# Altium footprint library PCB_IntegratedCircuit.PcbLib: 75 footprints (part 1 of 5)
Each footprint in its own frame and in the unit in brackets; x right, y up, seen from the top. Pads: shape width x height; smd on the part's side, far side on the other; paste and mask are expansions set on the pad; w line width, h text height; cw(c..) or ccw(c..) is an arc to the next point about the centre after c.
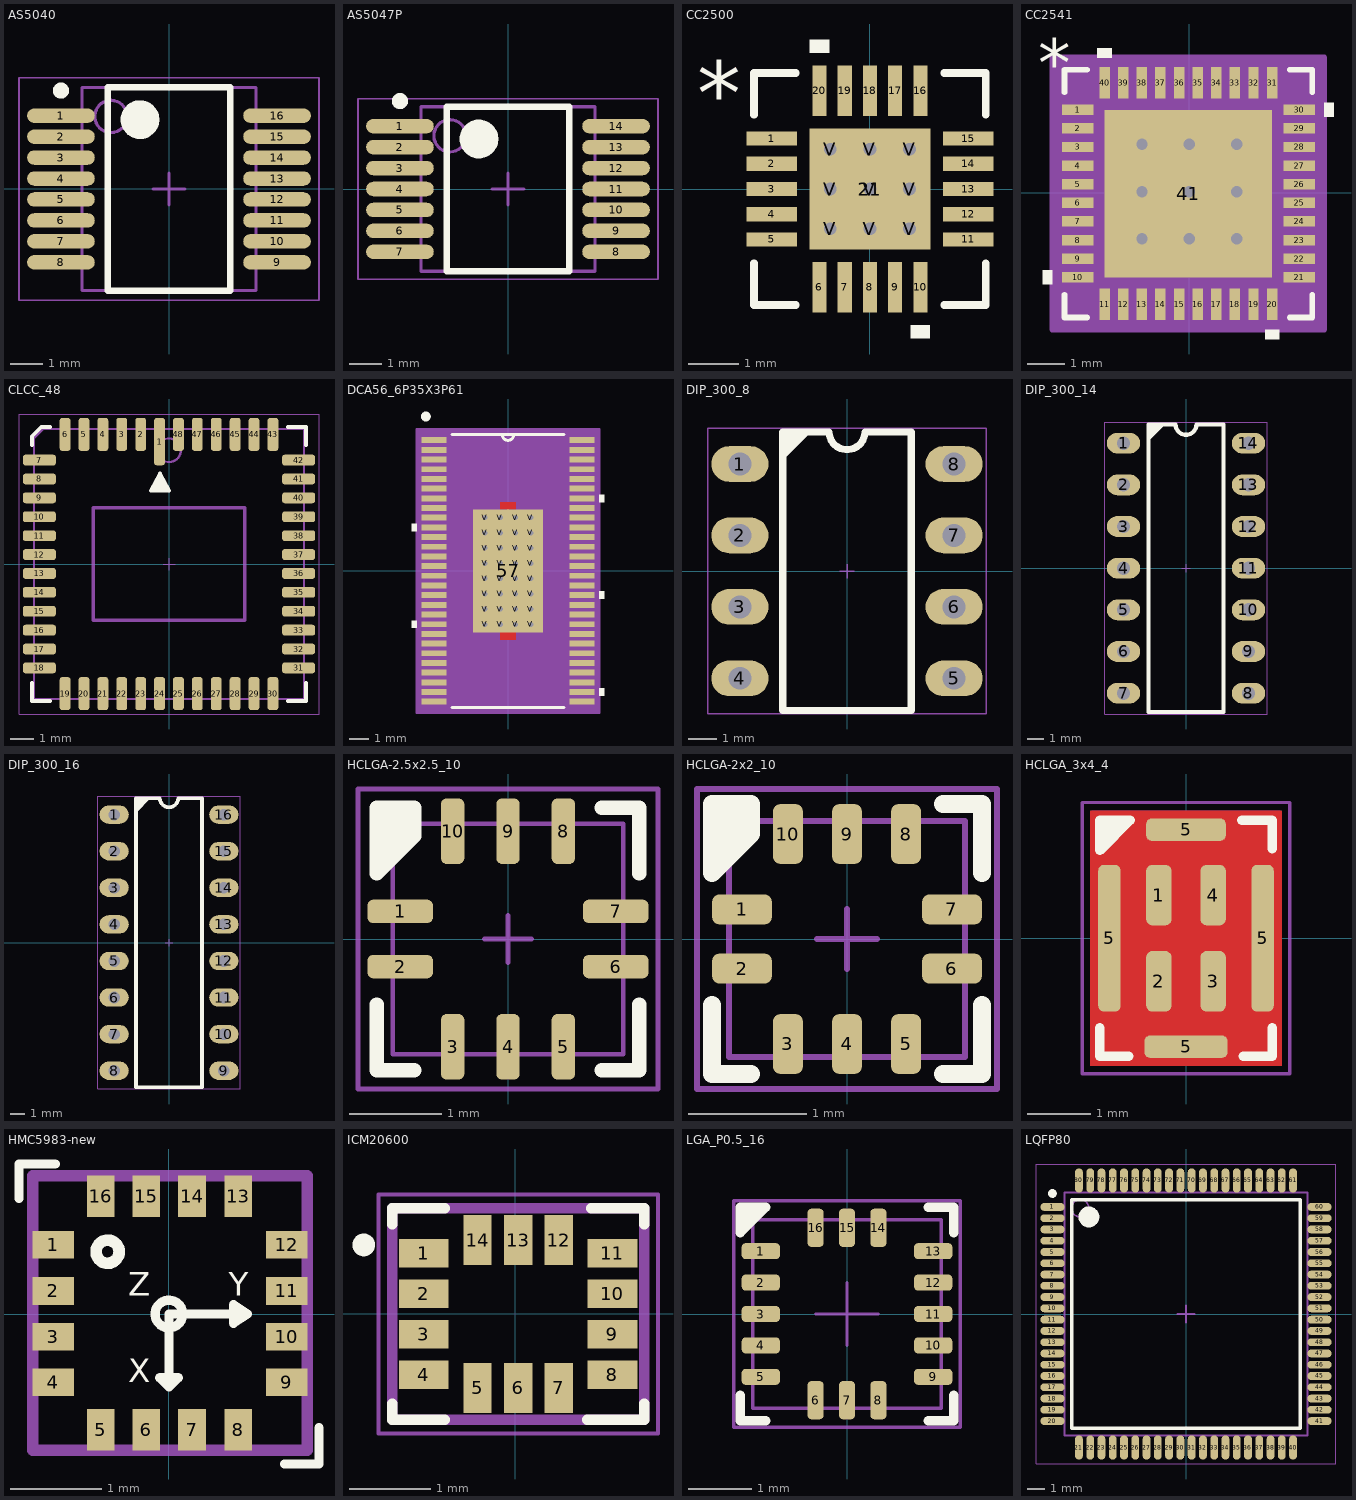
[diagram p0: the footprints below, top view; thin cyan lines are the x and y axes]

## AS5040 [mm] "SOP, 16-Leads, Body 6.20x5.29mm, Pitch 0.65mm, IPC Medium Density"
height 2.65
pads (16):
  oval 2.1x0.45 smd: 1(-3.35,2.275) 2(-3.35,1.625) 3(-3.35,0.975) 4(-3.35,0.325) 5(-3.35,-0.325) 6(-3.35,-0.975) 7(-3.35,-1.625) 8(-3.35,-2.275) 9(3.35,-2.275) 10(3.35,-1.625) 11(3.35,-0.975) 12(3.35,-0.325) 13(3.35,0.325) 14(3.35,0.975) 15(3.35,1.625) 16(3.35,2.275)
Top Overlay:
  circle w0.6: c-0.9,2.15 r0.3
  circle w0.25: c-3.35,3.05 r0.125
  lines w0.2: -1.9,-3.15 1.9,-3.15 1.9,3.15 -1.9,3.15 -1.9,-3.15
Mechanical 13:
  circle w0.1: c-1.8,2.25 r0.5
  lines w0.1: -2.7,-3.15 2.7,-3.15 2.7,3.15 -2.7,3.15 -2.7,-3.15
B-Component:
  lines w0.05: -4.65,-3.45 4.65,-3.45 4.65,3.45 -4.65,3.45 -4.65,-3.45
  lines w0.1: -0.5,0 0.5,0 ; 0,-0.5 0,0.5
3D body: height 2.65, standoff 0.1, extent -2.7,-3.15 2.7,3.15

## AS5047P [mm] "SOP, 14-Leads, Body 5.00x5.29mm, Pitch 0.65mm, IPC Medium Density"
height 2.65
pads (14):
  oval 2.1x0.45 smd: 1(-3.35,1.95) 2(-3.35,1.3) 3(-3.35,0.65) 4(-3.35,0) 5(-3.35,-0.65) 6(-3.35,-1.3) 7(-3.35,-1.95) 8(3.35,-1.95) 9(3.35,-1.3) 10(3.35,-0.65) 11(3.35,0) 12(3.35,0.65) 13(3.35,1.3) 14(3.35,1.95)
Top Overlay:
  circle w0.25: c-3.35,2.725 r0.125
  circle w0.6: c-0.9,1.55 r0.3
  lines w0.2: -1.9,-2.55 -1.9,2.55 1.9,2.55 1.9,-2.55 -1.9,-2.55
Mechanical 13:
  circle w0.1: c-1.8,1.65 r0.5
  lines w0.1: -2.7,-2.55 -2.7,2.55 2.7,2.55 2.7,-2.55 -2.7,-2.55
B-Component:
  lines w0.05: -4.65,-2.8 -4.65,2.8 4.65,2.8 4.65,-2.8 -4.65,-2.8
  lines w0.1: -0.5,0 0.5,0 ; 0,-0.5 0,0.5
3D body: height 2.65, standoff 0.1, extent -2.7,-2.55 2.7,2.55

## CC2500 [mm]
pads (30):
  rect 1x0.28 smd paste-0.14: 1(-1.95,1) 2(-1.95,0.5) 3(-1.95,0) 4(-1.95,-0.5) 5(-1.95,-1) 11(1.95,-1) 12(1.95,-0.5) 13(1.95,0) 14(1.95,0.5) 15(1.95,1)
  rect 0.28x1 smd paste-0.14: 6(-1,-1.95) 7(-0.5,-1.95) 8(0,-1.95) 9(0.5,-1.95) 10(1,-1.95) 16(1,1.95) 17(0.5,1.95) 18(0,1.95) 19(-0.5,1.95) 20(-1,1.95)
  rect 2.4x2.4 smd paste-1.187 mask-1.181: 21(0,0)
  round 0.508 / inner round 1.524 / far side round 0.508 hole 0.254: V(-0.787,-0.787) V(-0.787,0) V(-0.787,0.787) V(0,-0.787) V(0,0) V(0,0.787) V(0.787,-0.787) V(0.787,0) V(0.787,0.787)
Top Overlay:
  region: -0.81,2.704 -1.191,2.704 -1.191,2.958 -0.81,2.958
  region: 1.191,-2.704 0.81,-2.704 0.81,-2.958 1.191,-2.958
  lines w0.152: -2.299,-1.473 -2.299,-2.299 -1.473,-2.299 ; -2.299,1.473 -2.299,2.299 -1.473,2.299 ; 1.473,-2.299 2.299,-2.299 2.299,-1.473 ; 1.473,2.299 2.299,2.299 2.299,1.473
  text "*" at -3.429,1.27 h1.27
Top Paste:
  drawing of 36 lines, arcs and shapes, not listed
Top Solder:
  region: 0.987,-1.264 0.987,1.264 1.264,1.264 1.264,-1.264
  region: 0.587,-1.264 0.587,1.264 0.2,1.264 0.2,-1.264
  region: -0.2,-1.264 -0.2,1.264 -0.587,1.264 -0.587,-1.264
  region: -1.264,-1.264 -1.264,1.264 -0.987,1.264 -0.987,-1.264
  region: -1.264,-1.264 -1.264,-0.987 1.264,-0.987 1.264,-1.264
  region: -1.264,-0.587 -1.264,-0.2 1.264,-0.2 1.264,-0.587
  region: -1.264,0.2 -1.264,0.587 1.264,0.587 1.264,0.2
  region: -1.264,0.987 -1.264,1.264 1.264,1.264 1.264,0.987
  region: -0.79,2.52 -1.21,2.52 -1.21,1.38 -0.79,1.38
  region: -0.29,2.52 -0.71,2.52 -0.71,1.38 -0.29,1.38
  region: 0.21,2.52 -0.21,2.52 -0.21,1.38 0.21,1.38
  region: 0.71,2.52 0.29,2.52 0.29,1.38 0.71,1.38
  region: 1.21,2.52 0.79,2.52 0.79,1.38 1.21,1.38
  region: 2.52,1.21 1.38,1.21 1.38,0.79 2.52,0.79
  region: 2.52,0.71 1.38,0.71 1.38,0.29 2.52,0.29
  region: 2.52,0.21 1.38,0.21 1.38,-0.21 2.52,-0.21
  region: 2.52,-0.29 1.38,-0.29 1.38,-0.71 2.52,-0.71
  region: 2.52,-0.79 1.38,-0.79 1.38,-1.21 2.52,-1.21
  region: 1.21,-1.38 0.79,-1.38 0.79,-2.52 1.21,-2.52
  region: 0.71,-1.38 0.29,-1.38 0.29,-2.52 0.71,-2.52
  region: 0.21,-1.38 -0.21,-1.38 -0.21,-2.52 0.21,-2.52
  region: -0.29,-1.38 -0.71,-1.38 -0.71,-2.52 -0.29,-2.52
  region: -0.79,-1.38 -1.21,-1.38 -1.21,-2.52 -0.79,-2.52
  region: -1.38,-0.79 -2.52,-0.79 -2.52,-1.21 -1.38,-1.21
  region: -1.38,-0.29 -2.52,-0.29 -2.52,-0.71 -1.38,-0.71
  region: -1.38,0.21 -2.52,0.21 -2.52,-0.21 -1.38,-0.21
  region: -1.38,0.71 -2.52,0.71 -2.52,0.29 -1.38,0.29
  region: -1.38,1.21 -2.52,1.21 -2.52,0.79 -1.38,0.79
3D body "RTK20_2P4X2P4.stp": height 0.84, standoff 0, extent -2.095,-2.095 2.095,2.095

## CC2541 [mm]
pads (41):
  rect 0.85x0.28 smd paste-0.14: 1(-3,2.225) 2(-3,1.725) 3(-3,1.225) 4(-3,0.725) 5(-3,0.225) 6(-3,-0.275) 7(-3,-0.775) 8(-3,-1.275) 9(-3,-1.775) 10(-3,-2.275) 21(2.95,-2.275) 22(2.95,-1.775) 23(2.95,-1.275) 24(2.95,-0.775) 25(2.95,-0.275) 26(2.95,0.225) 27(2.95,0.725) 28(2.95,1.225) 29(2.95,1.725) 30(2.95,2.225)
  rect 0.28x0.85 smd paste-0.14: 11(-2.276,-3) 12(-1.776,-3) 13(-1.276,-3) 14(-0.776,-3) 15(-0.275,-3) 16(0.225,-3) 17(0.725,-3) 18(1.225,-3) 19(1.725,-3) 20(2.225,-3) 31(2.225,2.95) 32(1.725,2.95) 33(1.225,2.95) 34(0.725,2.95) 35(0.225,2.95) 36(-0.275,2.95) 37(-0.776,2.95) 38(-1.276,2.95) 39(-1.776,2.95) 40(-2.276,2.95)
  rect 4.5x4.5 smd paste-2.237 mask-2.235: 41(-0.025,-0.025)
via 1.27,-1.245 diameter 0.508 hole 0.305
via 0,-1.245 diameter 0.508 hole 0.305
via -1.27,-1.245 diameter 0.508 hole 0.305
via 1.27,0.025 diameter 0.508 hole 0.305
via 0,0.025 diameter 0.508 hole 0.305
via -1.27,0.025 diameter 0.508 hole 0.305
via 1.27,1.295 diameter 0.508 hole 0.305
via 0,1.295 diameter 0.508 hole 0.305
via -1.27,1.295 diameter 0.508 hole 0.305
Top Overlay:
  region: -2.085,3.629 -2.466,3.629 -2.466,3.883 -2.085,3.883
  region: 3.629,2.415 3.883,2.415 3.883,2.034 3.629,2.034
  region: 2.416,-3.679 2.035,-3.679 2.035,-3.933 2.416,-3.933
  region: -3.679,-2.085 -3.933,-2.085 -3.933,-2.466 -3.679,-2.466
  lines w0.152: -3.354,-2.748 -3.354,-3.354 -2.749,-3.354 ; -3.354,2.697 -3.354,3.304 -2.749,3.304 ; 2.698,-3.354 3.304,-3.354 3.304,-2.748 ; 2.698,3.304 3.304,3.304 3.304,2.697
  text "*" at -4.06,2.856 h1.27
Top Paste:
  drawing of 76 lines, arcs and shapes, not listed
Top Solder:
  drawing of 52 lines, arcs and shapes, not listed
Mechanical 13:
  text "*" at -4.06,2.856 h1.27
B-Component:
  region: 3.629,-3.679 -3.679,-3.679 -3.679,3.629 3.629,3.629
  lines w0.152: -3.679,-3.679 3.629,-3.679 3.629,3.629 -3.679,3.629 -3.679,-3.679
3D body "RHA40_4P5X4P5.stp": height 1.4, standoff 0, extent -3.151,-3.151 3.1,3.1

## CLCC_48 [mil]
height 90.55
pads (48):
  rrect50% 18x79 smd: 1(-15.75,204)
  rrect50% 18x55 smd: 2(-47.24,216) 3(-78.74,216) 4(-110.24,216) 5(-141.73,216) 6(-173.23,216) 19(-173.23,-216) 20(-141.73,-216) 21(-110.24,-216) 22(-78.74,-216) 23(-47.24,-216) 24(-15.75,-216) 25(15.75,-216) 26(47.24,-216) 27(78.74,-216) 28(110.24,-216) 29(141.73,-216) 30(173.23,-216) 43(173.23,216) 44(141.73,216) 45(110.24,216) 46(78.74,216) 47(47.24,216) 48(15.75,216)
  rrect50% 55x18 smd: 7(-216,173.23) 8(-216,141.73) 9(-216,110.24) 10(-216,78.74) 11(-216,47.24) 12(-216,15.75) 13(-216,-15.75) 14(-216,-47.24) 15(-216,-78.74) 16(-216,-110.24) 17(-216,-141.73) 18(-216,-173.23) 31(216,-173.23) 32(216,-141.73) 33(216,-110.24) 34(216,-78.74) 35(216,-47.24) 36(216,-15.75) 37(216,15.75) 38(216,47.24) 39(216,78.74) 40(216,110.24) 41(216,141.73) 42(216,173.23)
Top Overlay:
  region: -15,151 -30.26,122 0.26,122
  lines w6: -228.35,-197.83 -228.35,-228.35 -197.83,-228.35 ; -228.35,197.83 -228.35,213.09 -213.09,228.35 -197.83,228.35 ; 197.83,-228.35 228.35,-228.35 228.35,-197.83 ; 197.83,228.35 228.35,228.35 228.35,197.83 ; -30.26,122 0.26,122 -15,151 -30.26,122
Mechanical 13:
  circle w3.94: c0,189.57 r19.68
  lines w2: -10,0 10,0 ; 0,-10 0,10
  lines w3.94: -225,-225 -225,209.74 -209.74,225 225,225 225,-225 -225,-225
  lines w6: -126,-94 -126,94 126,94 126,-94 -126,-94
T-Component:
  lines w2: -250,-250 250,-250 250,250 -250,250 -250,-250
3D body "User Library-CLCC48.STEP": height 79.69, standoff 0, extent -250,-250 250,250

## DCA56_6P35X3P61 [mil]
pads (89):
  rect 50x12 smd: 1(-150.5,265.75) 2(-150.5,246.06) 3(-150.5,226.38) 4(-150.5,206.69) 5(-150.5,187.01) 6(-150.5,167.32) 7(-150.5,147.64) 8(-150.5,127.95) 9(-150.5,108.27) 10(-150.5,88.58) 11(-150.5,68.9) 12(-150.5,49.21) 13(-150.5,29.53) 14(-150.5,9.84) 15(-150.5,-9.84) 16(-150.5,-29.53) 17(-150.5,-49.21) 18(-150.5,-68.9) 19(-150.5,-88.58) 20(-150.5,-108.27) 21(-150.5,-127.95) 22(-150.5,-147.64) 23(-150.5,-167.32) 24(-150.5,-187.01) 25(-150.5,-206.69) 26(-150.5,-226.38) 27(-150.5,-246.06) 28(-150.5,-265.75) 29(150.5,-265.75) 30(150.5,-246.06) 31(150.5,-226.38) 32(150.5,-206.69) 33(150.5,-187.01) 34(150.5,-167.32) 35(150.5,-147.64) 36(150.5,-127.95) 37(150.5,-108.27) 38(150.5,-88.58) 39(150.5,-68.9) 40(150.5,-49.21) 41(150.5,-29.53) 42(150.5,-9.84) 43(150.5,9.84) 44(150.5,29.53) 45(150.5,49.21) 46(150.5,68.9) 47(150.5,88.58) 48(150.5,108.27) 49(150.5,127.95) 50(150.5,147.64) 51(150.5,167.32) 52(150.5,187.01) 53(150.5,206.69) 54(150.5,226.38) 55(150.5,246.06) 56(150.5,265.75)
  rect 142.13x250 smd mask-124.5: 57(0,0)
  round 20 / inner round 60 / far side round 20 hole 10: V(-46.5,-108.5) V(-46.5,-77.5) V(-46.5,-46.5) V(-46.5,-15.5) V(-46.5,15.5) V(-46.5,46.5) V(-46.5,77.5) V(-46.5,108.5) V(-15.5,-108.5) V(-15.5,-77.5) V(-15.5,-46.5) V(-15.5,-15.5) V(-15.5,15.5) V(-15.5,46.5) V(-15.5,77.5) V(-15.5,108.5) V(15.5,-108.5) V(15.5,-77.5) V(15.5,-46.5) V(15.5,-15.5) V(15.5,15.5) V(15.5,46.5) V(15.5,77.5) V(15.5,108.5) V(46.5,-108.5) V(46.5,-77.5) V(46.5,-46.5) V(46.5,-15.5) V(46.5,15.5) V(46.5,46.5) V(46.5,77.5) V(46.5,108.5)
Top Layer:
  region: 15.75,-125 -15.75,-125 -15.75,-139.96 15.75,-139.96 15.75,-125
  region: 15.75,125 -15.75,125 -15.75,139.96 15.75,139.96 15.75,125
Top Overlay:
  circle w10: c-167,314 r5
  region: 185.5,155.14 195.5,155.14 195.5,140.14 185.5,140.14
  region: 185.5,-41.71 195.5,-41.71 195.5,-56.71 185.5,-56.71
  region: 185.5,-238.56 195.5,-238.56 195.5,-253.56 185.5,-253.56
  region: -185.5,-100.77 -195.5,-100.77 -195.5,-115.77 -185.5,-115.77
  region: -185.5,96.08 -195.5,96.08 -195.5,81.08 -185.5,81.08
  lines w6: -113.73,-277.5 113.73,-277.5 ; -113.73,277.5 113.73,277.5 ; -12,277.5 ccw(c0,277.5) 12,277.5
Top Paste:
  drawing of 45 lines, arcs and shapes, not listed
Top Solder:
  region: 54.37,-127.5 54.37,127.5 73.56,127.5 73.56,-127.5
  region: 38.63,-127.5 38.63,127.5 23.37,127.5 23.37,-127.5
  region: 7.63,-127.5 7.63,127.5 -7.63,127.5 -7.63,-127.5
  region: -23.37,-127.5 -23.37,127.5 -38.63,127.5 -38.63,-127.5
  region: -73.56,-127.5 -73.56,127.5 -54.37,127.5 -54.37,-127.5
  region: -73.56,-127.5 -73.56,-116.37 73.56,-116.37 73.56,-127.5
  region: -73.56,-100.63 -73.56,-85.37 73.56,-85.37 73.56,-100.63
  region: -73.56,-69.63 -73.56,-54.37 73.56,-54.37 73.56,-69.63
  region: -73.56,-38.63 -73.56,-23.37 73.56,-23.37 73.56,-38.63
  region: -73.56,-7.63 -73.56,7.63 73.56,7.63 73.56,-7.63
  region: -73.56,23.37 -73.56,38.63 73.56,38.63 73.56,23.37
  region: -73.56,54.37 -73.56,69.63 73.56,69.63 73.56,54.37
  region: -73.56,85.37 -73.56,100.63 73.56,100.63 73.56,85.37
  region: -73.56,116.37 -73.56,127.5 73.56,127.5 73.56,116.37
  region: 15.75,-125 -15.75,-125 -15.75,-139.96 15.75,-139.96 15.75,-125
  region: 15.75,125 -15.75,125 -15.75,139.96 15.75,139.96 15.75,125
Mechanical 13:
  lines w0: -12,277.5 ccw(c0,277.5) 12,277.5
B-Component:
  region: 185.5,-287.5 -185.5,-287.5 -185.5,287.5 185.5,287.5
  lines w6: -185.5,-287.5 185.5,-287.5 185.5,287.5 -185.5,287.5 -185.5,-287.5
3D body "DCA56_6P35X3P61.stp": height 67.1, standoff 0, extent -163.5,-277.5 163.5,277.5

## DIP_300_8 [mil]
pads (8):
  oval 80x50 hole 32: 1(-150,150) 2(-150,50) 3(-150,-50) 4(-150,-150) 5(150,-150) 6(150,-50) 7(150,50) 8(150,150)
Top Overlay:
  region: -90,194.69 -50.63,194.69 -90,155.31
  lines w10: -90,-195 -90,195 -25,195 ccw(c0,195) 25,195 90,195 90,-195 -90,-195
Mechanical 13:
  lines w2: -10,0 10,0 ; 0,-10 0,10
T-Component:
  lines w2: -195,-200 -195,200 195,200 195,-200 -195,-200
3D body "User Library-DIP8test.STEP": height 179.92, standoff -150, extent -153.94,-195.07 153.94,195.08

## DIP_300_14 [mil]
pads (14):
  oval 80x50 hole 32: 1(-150,300) 2(-150,200) 3(-150,100) 4(-150,0) 5(-150,-100) 6(-150,-200) 7(-150,-300) 8(150,-300) 9(150,-200) 10(150,-100) 11(150,0) 12(150,100) 13(150,200) 14(150,300)
Top Overlay:
  region: -90,344.69 -50.63,344.69 -90,305.31
  lines w10: -90,-345 90,-345 90,345 25,345 cw(c0,345) -25,345 -90,345 -90,-345
Mechanical 13:
  lines w2: -10,0 10,0 ; 0,-10 0,10
T-Component:
  lines w2: -195,-350 195,-350 195,350 -195,350 -195,-350
3D body "SW3dPS-DIP14-300.STEP": height 200, standoff -98.03, extent -154.92,-383.86 154.93,383.86

## DIP_300_16 [mil]
pads (16):
  oval 80x50 hole 32: 1(-150,350) 2(-150,250) 3(-150,150) 4(-150,50) 5(-150,-50) 6(-150,-150) 7(-150,-250) 8(-150,-350) 9(150,-350) 10(150,-250) 11(150,-150) 12(150,-50) 13(150,50) 14(150,150) 15(150,250) 16(150,350)
Top Overlay:
  region: -90,394.69 -50.63,394.69 -90,355.31
  lines w10: -90,-395 90,-395 90,395 25,395 cw(c0,395) -25,395 -90,395 -90,-395
Mechanical 13:
  lines w2: -10,0 10,0 ; 0,-10 0,10
T-Component:
  lines w2: -195,-400 -195,400 195,400 195,-400 -195,-400
3D body "User Library-DIP16-22mm.STEP": height 202.76, standoff -98.03, extent -155,-433.07 154.84,433.07

## HCLGA-2.5x2.5_10 [mil]
height 31.5
pads (10):
  rrect50% 28x10 smd: 1(-46,11.81) 2(-46,-11.81) 6(46,-11.81) 7(46,11.81)
  rrect50% 10x28 smd: 3(-23.62,-46) 4(0,-46) 5(23.62,-46) 8(23.62,46) 9(0,46) 10(-23.62,46)
Top Overlay:
  region: -40,44 -40,56 -56,56 -56,28
  lines w6: -56,-28 -56,-56 -40,-56 ; 40,-56 56,-56 56,-28 ; 40,56 56,56 56,28 ; -56,28 -40,44 -40,56 -56,56 -56,28
Top Solder:
  rectangle: -23.62,32 23.62,60
  region: 23.62,-32 -23.62,-32 -23.62,-60 23.62,-60
  region: 60,-11.81 60,11.81 32,11.81 32,-11.81
  region: -32,-11.81 -32,11.81 -60,11.81 -60,-11.81
Mechanical 13:
  lines w2: -10,0 10,0 ; 0,-10 0,10 ; -49.21,-49.21 -49.21,49.22 49.22,49.22 49.22,-49.21 -49.21,-49.21
T-Component:
  lines w2: -64,-64 -64,64 64,64 64,-64 -64,-64
3D body "PQFN60P250X250X80-10N.step": height 31.5, standoff -0.04, extent -49.21,-49.21 49.22,49.22

## HCLGA-2x2_10 [mil]
height 31.5
pads (10):
  rrect50% 20x10 smd: 1(-35,9.84) 2(-35,-9.84) 6(35,-9.84) 7(35,9.84)
  rrect50% 10x20 smd: 3(-19.68,-35) 4(0,-35) 5(19.68,-35) 8(19.68,35) 9(0,35) 10(-19.68,35)
Top Overlay:
  region: -32,45 -45,45 -45,22 -32,35
  lines w6: -45,-22 -45,-45 -32,-45 ; 32,-45 45,-45 45,-22 ; 32,45 45,45 45,22 ; -45,22 -45,45 -32,45 -32,35 -45,22
Top Solder:
  region: -25,-9.84 -25,9.84 -45,9.84 -45,-9.84
  region: 45,-9.84 45,9.84 25,9.84 25,-9.84
  region: 19.68,45 -19.68,45 -19.68,25 19.68,25
  rectangle: -19.68,-45 19.68,-25
Mechanical 13:
  lines w2: -10,0 10,0 ; 0,-10 0,10 ; -39.37,-39.37 -39.37,39.37 39.37,39.37 39.37,-39.37 -39.37,-39.37
T-Component:
  lines w2: -50,-50 -50,50 50,50 50,-50 -50,-50
3D body "PQFN50P200X200X80-10N.step": height 31.5, standoff -0.04, extent -39.37,-39.37 39.37,39.37

## HCLGA_3x4_4 [mil]
pads (8):
  rrect50% 16x38 smd: 1(-17,27) 2(-17,-27) 3(17,-27) 4(17,27)
  rrect50% 14x92 smd: 5(-48,0) 5(48,0)
  rrect50% 52x14 smd: 5(0,-68)
  rrect50% 50x14 smd: 5(0,68)
Top Layer:
  pour cut-out: -60,80 60,80 60,-80 -60,-80
Top Overlay:
  region: -54,74 -35,74 -54,55
  lines w6: -54,-56 -54,-74 -36,-74 ; 35,74 54,74 54,56 ; 36,-74 54,-74 54,-56 ; -54,55 -35,74 -54,74 -54,55
Mechanical 13:
  lines w2: -10,0 10,0 ; 0,-10 0,10 ; -59,-79 -59,79 59,79 59,-79 -59,-79
T-Component:
  lines w2: -65,-85 65,-85 65,85 -65,85 -65,-85
3D body "User Library-DFN12(3x4).STEP": height 29.92, standoff 0, extent -59.08,-78.74 59.1,78.74

## HMC5983-new [mil] "HMC5983"
pads (16):
  rect 18x12 smd: 1(-50.2,30) 2(-50.2,10) 3(-50.2,-9.84) 4(-50.2,-29.53) 9(51,-29.53) 10(51,-9.84) 11(51,10) 12(51,30)
  rect 12x18 smd: 5(-29.53,-50.2) 6(-9.84,-50.2) 7(10,-50.2) 8(30,-50.2) 13(30,51) 14(10,51) 15(-9.84,51) 16(-29.53,51)
Top Overlay:
  circle w5: c-26.57,27 r5
  circle w4: c0,0 r6
  lines w4: -64.96,50 -64.96,65 -49.21,65 ; 50,-64.96 65,-64.96 65,-49.21 ; 0,-31.5 0,0 34,0 ; 0,-31.5 4,-27.56 -3.94,-27.56 0,-31.5 ; 34,0 28,4 28,-3.94 34,0
  text "X" at -17.72,-29.53 h10.2
  text "Y" at 26,8 h10.2
  text "Z" at -17.72,8 h10.2
Mechanical 16:
  lines w5: -59.06,-59.06 60,-59.06 ; -59.06,-59.06 -59.06,60 ; -59.06,-59.06 60,-59.06 ; -59.06,-59.06 -59.06,60 ; -59.06,60 60,60 ; -59.06,60 60,60 ; 60,-59.06 60,60 ; 60,-59.06 60,60
3D body "HMC5983.STEP": height 35.43, standoff 0, extent -59,-58.88 60.77,60.88

## ICM20600 [mm]
pads (14):
  rect 0.61x0.35 smd: 1(-1.127,0.746) 2(-1.127,0.246) 3(-1.127,-0.254) 4(-1.127,-0.754) 8(1.193,-0.754) 9(1.193,-0.254) 10(1.193,0.246) 11(1.193,0.746)
  rect 0.35x0.61 smd: 5(-0.467,-0.914) 6(0.033,-0.914) 7(0.533,-0.914) 12(0.533,0.906) 13(0.033,0.906) 14(-0.467,0.906)
Top Overlay:
  circle w0.14: c-1.867,0.846 r0.07
  lines w0.127: -1.517,-1.104 -1.517,-1.304 -0.867,-1.304 ; -1.517,1.096 -1.517,1.296 -0.867,1.296 ; 0.883,-1.304 1.583,-1.304 1.583,-1.104 ; 0.933,1.296 1.583,1.296 1.583,1.096
Mechanical 4:
  lines w0.127: -1.517,-1.304 -1.517,1.296 ; -1.517,-1.304 1.583,-1.304 ; -1.517,-1.304 -1.517,1.296 ; -1.517,-1.304 1.583,-1.304 ; -1.517,1.296 1.583,1.296 ; -1.517,1.296 1.583,1.296 ; 1.583,-1.304 1.583,1.296 ; 1.583,-1.304 1.583,1.296
Mechanical 16:
  lines w0.05: -1.687,-1.474 1.753,-1.474 1.753,1.466 -1.687,1.466 -1.687,-1.474

## LGA_P0.5_16 [mil]
height 29.53
pads (16):
  rrect50% 24x10 smd: 1(-54,39.37) 2(-54,19.68) 3(-54,0) 4(-54,-19.68) 5(-54,-39.37) 9(54,-39.37) 10(54,-19.68) 11(54,0) 12(54,19.68) 13(54,39.37)
  rrect50% 10x24 smd: 6(-19.68,-54) 7(0,-54) 8(19.68,-54) 14(19.68,54) 15(0,54) 16(-19.68,54)
Top Overlay:
  region: -67,67 -51,67 -67,51
  lines w6: -67,-51 -67,-67 -51,-67 ; 51,-67 67,-67 67,-51 ; 51,67 67,67 67,51 ; -67,51 -67,67 -51,67 -67,51
Top Solder:
  region: 20,-41 -20,-41 -20,-67 20,-67
  region: -41,-40 -41,40 -67,40 -67,-40
  region: 41,40 41,-40 67,-40 67,40
  rectangle: -20,41 20,67
Mechanical 13:
  lines w2: -19.68,0 19.68,0 ; 0,-19.68 0,19.68 ; -59.06,-59.06 59.06,-59.06 59.06,59.06 -59.06,59.06 -59.06,-59.06
T-Component:
  lines w2: -71,-71 71,-71 71,71 -71,71 -71,-71
3D body "PQFN50P300X300X75-16L.step": height 29.53, standoff 0, extent -59.06,-59.06 59.06,59.06

## LQFP80 [mm]
height 2.45
pads (80):
  oval 1.4x0.45 smd: 1(-7.7,6.175) 2(-7.7,5.525) 3(-7.7,4.875) 4(-7.7,4.225) 5(-7.7,3.575) 6(-7.7,2.925) 7(-7.7,2.275) 8(-7.7,1.625) 9(-7.7,0.975) 10(-7.7,0.325) 11(-7.7,-0.325) 12(-7.7,-0.975) 13(-7.7,-1.625) 14(-7.7,-2.275) 15(-7.7,-2.925) 16(-7.7,-3.575) 17(-7.7,-4.225) 18(-7.7,-4.875) 19(-7.7,-5.525) 20(-7.7,-6.175) 41(7.7,-6.175) 42(7.7,-5.525) 43(7.7,-4.875) 44(7.7,-4.225) 45(7.7,-3.575) 46(7.7,-2.925) 47(7.7,-2.275) 48(7.7,-1.625) 49(7.7,-0.975) 50(7.7,-0.325) 51(7.7,0.325) 52(7.7,0.975) 53(7.7,1.625) 54(7.7,2.275) 55(7.7,2.925) 56(7.7,3.575) 57(7.7,4.225) 58(7.7,4.875) 59(7.7,5.525) 60(7.7,6.175)
  oval 0.45x1.4 smd: 21(-6.175,-7.7) 22(-5.525,-7.7) 23(-4.875,-7.7) 24(-4.225,-7.7) 25(-3.575,-7.7) 26(-2.925,-7.7) 27(-2.275,-7.7) 28(-1.625,-7.7) 29(-0.975,-7.7) 30(-0.325,-7.7) 31(0.325,-7.7) 32(0.975,-7.7) 33(1.625,-7.7) 34(2.275,-7.7) 35(2.925,-7.7) 36(3.575,-7.7) 37(4.225,-7.7) 38(4.875,-7.7) 39(5.525,-7.7) 40(6.175,-7.7) 61(6.175,7.7) 62(5.525,7.7) 63(4.875,7.7) 64(4.225,7.7) 65(3.575,7.7) 66(2.925,7.7) 67(2.275,7.7) 68(1.625,7.7) 69(0.975,7.7) 70(0.325,7.7) 71(-0.325,7.7) 72(-0.975,7.7) 73(-1.625,7.7) 74(-2.275,7.7) 75(-2.925,7.7) 76(-3.575,7.7) 77(-4.225,7.7) 78(-4.875,7.7) 79(-5.525,7.7) 80(-6.175,7.7)
Top Overlay:
  circle w0.6: c-5.6,5.6 r0.3
  circle w0.25: c-7.7,6.95 r0.125
  lines w0.2: -6.6,-6.6 6.6,-6.6 6.6,6.6 -6.6,6.6 -6.6,-6.6
Mechanical 13:
  circle w0.1: c-6.1,6.1 r0.5
  lines w0.1: -7,-7 7,-7 7,7 -7,7 -7,-7
B-Component:
  lines w0.05: -8.65,-8.65 8.65,-8.65 8.65,8.65 -8.65,8.65 -8.65,-8.65
  lines w0.1: -0.5,0 0.5,0 ; 0,-0.5 0,0.5
3D body: height 2.45, standoff 0.25, extent -7,-7 7,7